# Altium footprint library Miscellaneous Devices LC.PcbLib: 776 footprints (part 11 of 49)
Each footprint in its own frame and in the unit in brackets; x right, y up, seen from the top. Pads: shape width x height; smd on the part's side, far side on the other; paste and mask are expansions set on the pad; w line width, h text height; cw(c..) or ccw(c..) is an arc to the next point about the centre after c.
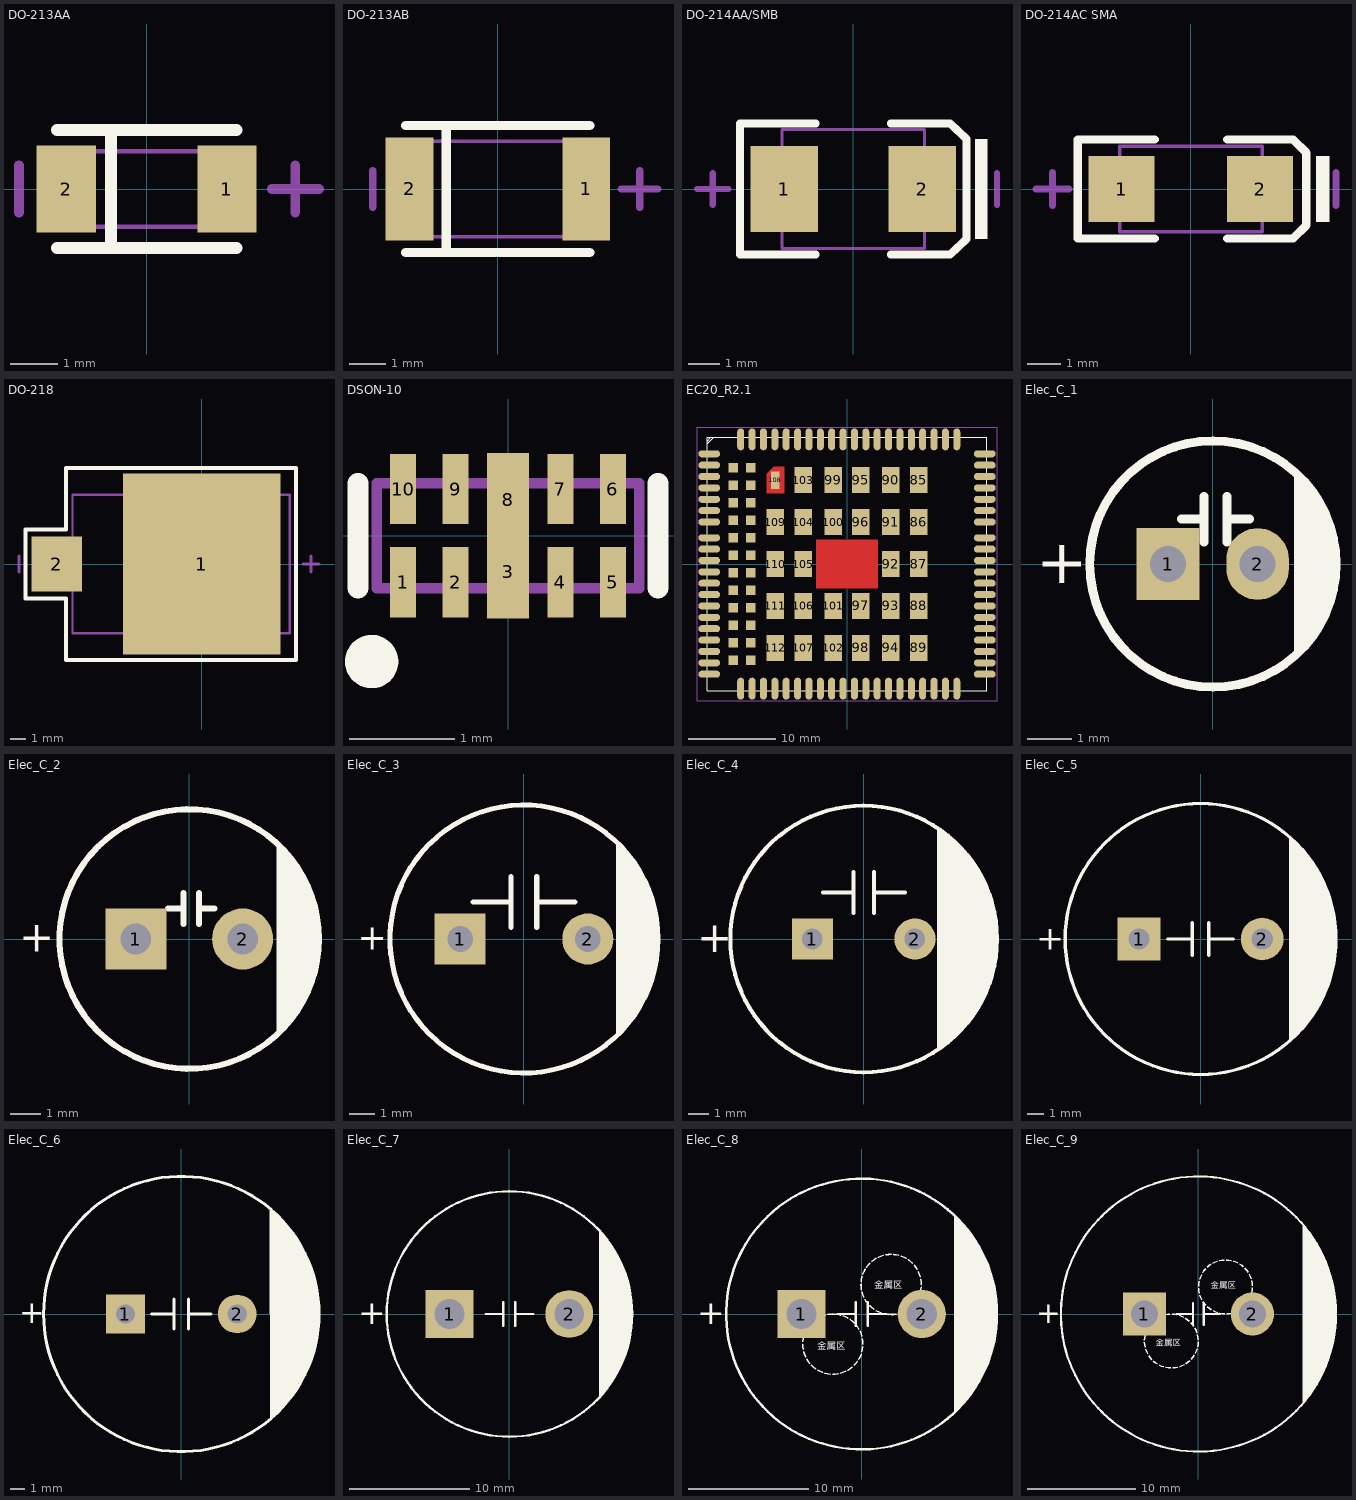
[diagram p10: the footprints below, top view; thin cyan lines are the x and y axes]

## DO-213AA [mm]
pads (2):
  rect 1.25x1.85 smd: 1(1.7,0) 2(-1.7,0)
Top Overlay:
  lines w0.254: -1.9,-1.25 1.9,-1.25 ; -1.9,1.25 1.9,1.25 ; -0.75,-1.25 -0.75,1.25
Mechanical 13:
  lines w0.1: -1.8,-0.8 1.8,-0.8 1.8,0.8 -1.8,0.8 -1.8,-0.8
Mechanical 15:
  lines w0.203: -2.7,-0.5 -2.7,0.5 ; 2.65,0 3.65,0 ; 3.15,-0.5 3.15,0.5

## DO-213AB [mm]
pads (2):
  rect 1.3x2.8 smd: 1(2.4,0) 2(-2.4,0)
Top Overlay:
  lines w0.254: -2.5,-1.725 2.5,-1.725 ; -2.5,1.725 2.5,1.725 ; -1.4,-1.725 -1.4,1.7
Mechanical 13:
  lines w0.1: -2.5,-1.3 2.5,-1.3 2.5,1.3 -2.5,1.3 -2.5,-1.3
Mechanical 15:
  lines w0.203: -3.4,-0.5 -3.4,0.5 ; 3.35,0 4.35,0 ; 3.85,-0.5 3.85,0.5

## DO-214AA/SMB [mm]
pads (2):
  rect 2.159x2.743 smd: 1(-2.21,0) 2(2.21,0)
Top Overlay:
  region: 4.296,1.6 3.896,1.6 3.896,-1.6 4.296,-1.6
  lines w0.254: -1.2,-2.1 -3.625,-2.1 -3.625,2.1 -1.2,2.1 ; 1.2,-2.1 3.1,-2.1 3.625,-1.6 3.625,1.6 3.1,2.1 1.2,2.1
Mechanical 13:
  lines w0.1: -2.285,-1.905 2.285,-1.905 2.285,1.905 -2.285,1.905 -2.285,-1.905
Mechanical 15:
  lines w0.203: -5,0 -4,0 ; -4.5,-0.5 -4.5,0.5 ; 4.6,-0.5 4.6,0.5
3D body "DO-214AA.STEP": height 2.5, standoff 0, extent -2.8,-1.95 2.8,1.95

## DO-214AC SMA [mm]
pads (2):
  rect 2x2 smd: 1(-2.1,0) 2(2.1,0)
Top Overlay:
  region: 4.2,1 3.8,1 3.8,-1 4.2,-1
  lines w0.254: -1.1,-1.5 -3.431,-1.5 -3.431,1.5 -1.1,1.5 ; 1.1,-1.5 3.1,-1.5 3.5,-1.1 3.5,1.1 3.1,1.5 1.1,1.5
Mechanical 13:
  lines w0.1: -2.16,-1.3 -2.16,1.3 2.16,1.3 2.16,-1.3 -2.16,-1.3
Mechanical 15:
  lines w0.203: -4.7,0 -3.7,0 ; -4.2,-0.5 -4.2,0.5 ; 4.4,-0.5 4.4,0.5
3D body "DO-214AC.STEP": height 2.4, standoff 0, extent -2.2,-1.25 2.4,1.45

## DO-218 [mm] "=DO-218AB"
pads (2):
  rect 10x11.5 smd: 1(0,0)
  rect 3.2x3.5 smd: 2(-9.2,0)
Top Overlay:
  lines w0.254: -11.2,-2.2 -11.2,2.2 -8.6,2.2 -8.6,6.1 6,6.1 6,-6.1 -8.6,-6.1 -8.6,-2.2 -11.2,-2.2
Mechanical 13:
  lines w0.152: -8.2,-4.4 -8.2,4.4 5.6,4.4 5.6,-4.4 -8.2,-4.4
Mechanical 15:
  lines w0.203: -11.6,-0.5 -11.6,0.5 ; 6.45,0 7.45,0 ; 6.95,-0.5 6.95,0.5
3D body "User Library-DO-218AB.STEP": height 5, standoff 0, extent -9.8,-5 5.629,5

## DSON-10 [mm]
pads (10):
  rect 0.25x0.67 smd mask+0.051: 1(-1,-0.445) 2(-0.5,-0.445) 4(0.5,-0.445) 5(1,-0.445) 6(1,0.445) 7(0.5,0.445) 9(-0.5,0.445) 10(-1,0.445)
  rect 0.4x0.889 smd mask+0.051: 3(0,-0.343) 8(0,0.343)
Top Overlay:
  circle w0.254: c-1.3,-1.2 r0.127
  lines w0.2: -1.43,-0.5 -1.43,0.5 ; 1.43,-0.5 1.43,0.5
Mechanical 13:
  lines w0.1: -1.25,-0.5 1.25,-0.5 1.25,0.5 -1.25,0.5 -1.25,-0.5

## EC20_R2.1 [mm]
pads (132):
  oval 2.5x0.8 smd mask+0.05: 1(-15.75,12.6) 2(-15.75,11.3) 3(-15.75,10) 4(-15.75,8.7) 5(-15.75,7.4) 6(-15.75,6.1) 7(-15.75,4.8) 8(-15.75,0.4) 9(-15.75,-0.9) 10(-15.75,-2.2) 11(-15.75,-3.5) 12(-15.75,-4.8) 13(-15.75,-6.1) 14(-15.75,-7.4) 15(-15.75,-8.7) 16(-15.75,-10) 17(-15.75,-11.3) 18(-15.75,-12.6) 37(15.75,-12.6) 38(15.75,-11.3) 39(15.75,-10) 40(15.75,-8.7) 41(15.75,-7.4) 42(15.75,-6.1) 43(15.75,-4.8) 44(15.75,-3.5) 45(15.75,-2.2) 46(15.75,-0.9) 47(15.75,0.4) 48(15.75,4.8) 49(15.75,6.1) 50(15.75,7.4) 51(15.75,8.7) 52(15.75,10) 53(15.75,11.3) 54(15.75,12.6) 141(-15.75,3) 142(-15.75,1.7) 143(15.75,1.7) 144(15.75,3)
  oval 0.8x2.5 smd mask+0.05: 19(-9.55,-14.25) 20(-8.25,-14.25) 21(-6.95,-14.25) 22(-5.65,-14.25) 23(-4.35,-14.25) 24(-3.05,-14.25) 25(-1.75,-14.25) 26(-0.45,-14.25) 27(0.85,-14.25) 28(2.15,-14.25) 29(3.45,-14.25) 30(4.75,-14.25) 31(6.05,-14.25) 32(7.35,-14.25) 33(8.65,-14.25) 34(9.95,-14.25) 35(11.25,-14.25) 36(12.55,-14.25) 55(12.55,14.25) 56(11.25,14.25) 57(9.95,14.25) 58(8.65,14.25) 59(7.35,14.25) 60(6.05,14.25) 61(4.75,14.25) 62(3.45,14.25) 63(2.15,14.25) 64(0.85,14.25) 65(-0.45,14.25) 66(-1.75,14.25) 67(-3.05,14.25) 68(-4.35,14.25) 69(-5.65,14.25) 70(-6.95,14.25) 71(-8.25,14.25) 72(-9.55,14.25) 113(-10.85,14.25) 114(-12.15,14.25) 115(-10.85,-14.25) 116(-12.15,-14.25)
  rect 2x3 smd mask+0.05: 85(8.2,9.6) 86(8.2,4.8) 87(8.2,0) 88(8.2,-4.8) 89(8.2,-9.6) 90(5,9.6) 91(5,4.8) 92(5,0) 93(5,-4.8) 94(5,-9.6) 95(1.6,9.6) 96(1.6,4.8) 97(1.6,-4.8) 98(1.6,-9.6) 99(-1.6,9.6) 100(-1.6,4.8) 101(-1.6,-4.8) 102(-1.6,-9.6) 103(-5,9.6) 104(-5,4.8) 105(-5,0) 106(-5,-4.8) 107(-5,-9.6) 109(-8.2,4.8) 110(-8.2,0) 111(-8.2,-4.8) 112(-8.2,-9.6)
  rect 1x2 smd: 108(-8.2,9.6)
  rect 1.1x1.1 smd mask+0.05: 117(-11,11) 118(-11,9) 119(-11,7) 120(-11,5) 121(-11,3) 122(-11,1) 123(-11,-1) 124(-11,-3) 125(-11,-5) 126(-11,-7) 127(-11,-9) 128(-11,-11) 129(-13,11) 130(-13,9) 131(-13,7) 132(-13,5) 133(-13,3) 134(-13,1) 135(-13,-1) 136(-13,-3) 137(-13,-5) 138(-13,-7) 139(-13,-9) 140(-13,-11)
Top Layer:
  region: -9.2,10.3 -8.4,11.1 -7.2,11.1 -7.2,8.1 -9.2,8.1
  pour cut-out: 3.5,2.8 -3.5,2.8 -3.5,-2.8 3.5,-2.8
Top Overlay:
  lines w0.102: -16,13.75 -15.25,14.5 ; -16,14.5 16,14.5 16,-14.5 -16,-14.5 -16,14.5 ; -16,14.5 -15.55,14.5 -16,14.05 -16,14.5
Top Paste:
  region: -9.2,10.3 -8.4,11.1 -7.2,11.1 -7.2,8.1 -9.2,8.1
Top Solder:
  region: -9.25,8.05 -7.15,8.05 -7.15,11.15 -8.45,11.15 -9.25,10.35
Mechanical 1:
  lines w0.01: -17.15,-15.65 17.15,-15.65 17.15,15.65 -17.15,15.65 -17.15,-15.65

## Elec_C_1 [mm]
pads (2):
  rect 1.4x1.6 hole 0.8: 1(-1,0)
  oval 1.4x1.6 hole 0.8: 2(1,0)
Top Overlay:
  circle w0.2: c0,0 r2.75
  region: 2.125,1.85 1.9,1.85 1.9,1.475 2.125,1.475
  region: 2.275,1.6 1.9,1.6 1.9,1.275 2.275,1.275
  region: 2.425,1.4 1.925,1.4 1.925,0.975 2.425,0.975
  region: 2.475,-0.85 2.275,-0.85 2.275,-1.225 2.475,-1.225
  region: 2.375,-0.875 2.125,-0.875 2.125,-1.425 2.375,-1.425
  region: 2.075,-1.55 1.875,-1.55 1.875,-1.825 2.075,-1.825
  region: 2.175,-1.4 1.875,-1.4 1.875,-1.7 2.175,-1.7
  region: 2.25,-0.95 1.875,-0.95 1.875,-1.55 2.25,-1.55
  region: 2.55,1.15 1.9,1.15 1.9,-1.05 2.55,-1.05
  region: 2.725,0.4 2.475,0.4 2.475,-0.625 2.725,-0.625
  region: 2.575,0.975 2.225,0.975 2.225,-0.975 2.575,-0.975
  region: 2.65,0.8 2.4,0.8 2.4,-0.55 2.65,-0.55
  lines w0.127: 1.875,-1.975 1.875,1.95
  lines w0.2: -0.702,1 -0.194,1 ; -0.194,0.492 -0.194,1.508 ; 0.314,0.492 0.314,1.508 ; 0.314,1 0.822,1
  text "+" at -3.95,-0.425 h1
3D body "CAPACITOR- PANASONIC M SERIES.STEP": height 11, standoff -5, extent -2.377,-2.667 2.623,2.333

## Elec_C_2 [mm]
pads (2):
  rect 2x2 hole 1: 1(-1.75,0)
  round 2 hole 1: 2(1.75,0)
Top Overlay:
  circle w0.2: c0,0 r4.25
  lines w0.127: 2.925,-3.075 2.925,3.1 ; 3,2.925 3.025,-2.975 ; 3.075,-2.875 3.125,2.775 ; 3.075,2.85 3.1,2.55 ; 3.175,-2.725 3.225,2.7 ; 3.25,-2.625 3.325,2.575 ; 3.35,-2.6 3.4,2.475 ; 3.45,-2.4 3.5,2.3 ; 3.5,-2.225 3.575,2.225 ; 3.6,-2.15 3.675,2.05 ; 3.7,-1.95 3.775,1.875 ; 3.8,-1.825 3.85,1.625 ; 3.875,-1.525 3.925,1.475 ; 3.95,-1.275 4.05,1.2 4.025,1.2 ; 4.05,-1 4.1,0.775 ; 4.1,-0.6 4.15,0.25
  lines w0.2: -0.702,1 -0.194,1 ; -0.194,0.492 -0.194,1.508 ; 0.314,0.492 0.314,1.508 ; 0.314,1 0.822,1
  text "+" at -5.575,-0.425 h1
3D body "8X12.STEP": height 12, standoff -2.5, extent -3.96,-4.047 4.04,3.953

## Elec_C_3 [mm]
pads (2):
  rect 2x2 hole 1: 1(-2.5,0)
  round 2 hole 1: 2(2.5,0)
Top Overlay:
  circle w0.2: c0,0 r5.25
  lines w0.127: 3.675,-3.775 3.675,3.725 ; 3.725,3.65 3.775,-3.55 ; 3.825,3.525 3.875,-3.45
  lines w0.2: -2,1.447 -0.5,1.447 ; -0.5,0.447 -0.5,2.447 ; 0.5,0.447 0.5,2.447 ; 0.5,1.447 2,1.447
  lines w0.254: 3.9,3.375 3.95,-3.225 ; 4.05,3.2 4.075,-3.1 ; 4.175,3.025 4.225,-2.925 ; 4.35,-2.725 4.35,2.725 ; 4.5,-2.475 4.5,2.525 ; 4.6,-2.175 4.65,2.2 ; 4.775,-1.95 4.775,1.925 ; 4.9,-1.575 4.925,1.5 ; 5.025,-1.05 5.05,1.025
  text "+" at -6.5,-0.425 h1
3D body "10X12.STEP": height 12, standoff -2.5, extent -4.833,-4.92 5.167,5.08

## Elec_C_4 [mm]
pads (2):
  rect 2x2 hole 1: 1(-2.5,0)
  round 2 hole 1: 2(2.5,0)
Top Overlay:
  circle w0.2: c0,0 r6.5
  lines w0.2: -1.99,2.272 -0.49,2.272 ; -0.49,1.272 -0.49,3.272 ; 0.51,1.272 0.51,3.272 ; 0.51,2.272 2.01,2.272
  lines w0.254: 3.7,-5.3 3.7,5.25 ; 3.85,-5.125 3.875,5.1 ; 3.975,-4.975 4.025,5 ; 4.125,-4.925 4.125,4.825 ; 4.275,4.775 4.325,-4.75 ; 4.45,-4.6 4.45,4.6 ; 4.6,-4.45 4.6,4.475 ; 4.725,-4.3 4.8,4.25 ; 4.9,-4.2 4.9,4.1 ; 5.025,-3.975 5.075,3.9 ; 5.15,-3.725 5.2,3.775 ; 5.325,-3.6 5.375,3.475 ; 5.475,3.35 5.5,-3.275 ; 5.6,-3.1 5.625,3.05 ; 5.725,2.825 5.775,-2.85 ; 5.875,2.55 5.9,-2.575 ; 6,2.275 6.05,-2.075 ; 6.125,1.825 6.2,-1.675 ; 6.25,1.275 6.3,-1.05
  text "+" at -8.125,-0.65 h1.5
3D body "RB_2__4.STEP": height 20.1, standoff -3, extent -6.218,-6.277 6.282,6.223

## Elec_C_5 [mm]
pads (2):
  rect 2.6x2.6 hole 1.3: 1(-3.75,0)
  round 2.6 hole 1.3: 2(3.75,0)
Top Overlay:
  circle w0.2: c0,0 r8.25
  lines w0.2: -2,0 -0.5,0 ; -0.5,-1 -0.5,1 ; 0.5,-1 0.5,1 ; 0.5,0 2,0
  lines w0.254: 5.5,-6.1 5.5,6.1 ; 5.65,-5.9 5.675,5.825 ; 5.8,-5.7 5.8,5.75 ; 5.975,-5.6 5.975,5.55 ; 6.1,5.475 6.125,-5.325 ; 6.275,5.2 6.3,-5.25 ; 6.425,5.075 6.45,-4.95 ; 6.575,-4.825 6.575,4.8 ; 6.675,-4.575 6.7,4.65 ; 6.8,-4.475 6.85,4.4 ; 6.975,-4.225 6.975,4.225 ; 7.1,-4.05 7.125,3.925 ; 7.225,3.75 7.275,-3.675 ; 7.375,3.45 7.4,-3.425 ; 7.5,3.2 7.55,-3.05 ; 7.675,-2.8 7.675,2.775 ; 7.8,-2.275 7.8,2.375 ; 7.9,1.875 7.925,-1.925 ; 8.025,1.4 8.1,-1.225
  text "+" at -10.025,-0.65 h1.5
3D body "Capacitor RB_3_6.step": height 25.2, standoff -3.4, extent -8.025,-8.131 7.975,7.869

## Elec_C_6 [mm]
pads (2):
  rect 2.6x2.6 hole 1.3: 1(-3.75,0)
  round 2.6 hole 1.3: 2(3.75,0)
Top Overlay:
  circle w0.2: c0,0 r9.25
  lines w0.2: -2,0 -0.5,0 ; -0.5,-1 -0.5,1 ; 0.5,-1 0.5,1 ; 0.5,0 2,0
  lines w0.254: 6.05,6.95 6.075,-6.925 ; 6.175,6.7 6.225,-6.725 ; 6.3,6.625 6.4,-6.55 ; 6.5,6.4 6.525,-6.475 ; 6.65,6.325 6.7,-6.275 ; 6.8,-6.125 6.85,6.075 ; 6.95,5.975 6.975,-5.875 ; 7.075,5.75 7.125,-5.775 ; 7.225,5.65 7.275,-5.5 ; 7.4,5.45 7.45,-5.35 ; 7.55,5.2 7.6,-5.075 ; 7.725,4.925 7.75,-4.875 ; 7.85,4.675 7.95,-4.55 ; 8.05,4.425 8.075,-4.325 ; 8.15,4.075 8.225,-3.975 ; 8.325,3.8 8.4,-3.725 ; 8.45,3.475 8.55,-3.225 ; 8.625,3.125 8.7,-2.9 ; 8.725,2.65 8.875,-2.3 ; 8.875,2.225 8.975,-1.725 ; 9.025,1.5 9.1,-1.05
  text "+" at -10.9,-0.625 h1.5
3D body "RB_3_6.STEP": height 25.2, standoff -3.4, extent -8.03,-8 7.97,8

## Elec_C_7 [mm]
pads (2):
  rect 4x4 hole 2.5: 1(-5,0)
  round 4 hole 2.5: 2(5,0)
Top Overlay:
  circle w0.2: c0,0 r10.25
  region: 7.825,6.675 7.55,6.675 7.55,6.1 7.825,6.1
  region: 7.775,6.8 7.575,6.8 7.575,6.55 7.775,6.55
  region: 7.925,6.5 7.55,6.5 7.55,5.75 7.925,5.75
  region: 8.075,6.4 7.55,6.4 7.55,4.45 8.075,4.45
  region: 8.25,6.2 7.95,6.2 7.95,5.375 8.25,5.375
  region: 8.35,5.975 7.85,5.975 7.85,4.75 8.35,4.75
  region: 8.475,5.85 7.975,5.85 7.975,3.725 8.475,3.725
  region: 8.625,5.625 8.125,5.625 8.125,4.6 8.625,4.6
  region: 8.775,5.375 8.275,5.375 8.275,4.625 8.775,4.625
  region: 8.95,5.125 8.375,5.125 8.375,4.625 8.95,4.625
  region: 9.075,4.825 8.475,4.825 8.475,3.95 9.075,3.95
  region: 9.2,4.575 8.575,4.575 8.575,3.475 9.2,3.475
  region: 9.35,4.35 8.85,4.35 8.85,3.225 9.35,3.225
  region: 9.5,3.975 9.05,3.975 9.05,3.075 9.5,3.075
  region: 9.6,3.625 9.15,3.625 9.15,2.85 9.6,2.85
  region: 9.725,3.425 9.325,3.425 9.325,2.475 9.725,2.475
  region: 9.85,3.05 9.275,3.05 9.275,2.05 9.85,2.05
  region: 9.95,2.6 9.025,2.6 9.025,0.575 9.95,0.575
  region: 10.075,2.075 9.05,2.075 9.05,0.1 10.075,0.1
  region: 10.175,1.4 9.1,1.4 9.1,-0.95 10.175,-0.95
  region: 10.15,-0.7 9.15,-0.7 9.15,-1.525 10.15,-1.525
  region: 10.1,-1.275 9.075,-1.275 9.075,-1.825 10.1,-1.825
  region: 10.025,-1.5 9.475,-1.5 9.475,-2.1 10.025,-2.1
  region: 9.95,-1.525 9.3,-1.525 9.3,-2.35 9.95,-2.35
  region: 9.9,-1.775 9.15,-1.775 9.15,-2.475 9.9,-2.475
  region: 9.85,-2.275 9.05,-2.275 9.05,-2.95 9.85,-2.95
  region: 9.75,-2.475 8.825,-2.475 8.825,-3.175 9.75,-3.175
  region: 9.675,-2.775 8.675,-2.775 8.675,-3.45 9.675,-3.45
  region: 9.575,-2.975 8.625,-2.975 8.625,-3.725 9.575,-3.725
  region: 9.475,-3.45 8.475,-3.45 8.475,-3.95 9.475,-3.95
  region: 9.112,-3.588 8.7,-4 9.038,-4.337 9.45,-3.925
  region: 8.575,-3.775 8.575,-4.325 9.275,-4.325 9.275,-3.775
  region: 8.875,-3.675 8.875,-4.225 9.35,-4.225 9.35,-3.675
  region: 8.325,-3.95 8.325,-4.575 9.2,-4.575 9.2,-3.95
  region: 8,-4.025 8,-4.75 9.075,-4.75 9.075,-4.025
  region: 8,-4.275 8,-5.1 8.9,-5.1 8.9,-4.275
  region: 8.65,-4.4 8.65,-4.925 9.05,-4.925 9.05,-4.4
  region: 7.975,-4.725 7.975,-5.325 8.775,-5.325 8.775,-4.725
  region: 7.775,-5.2 7.775,-5.475 8.675,-5.475 8.675,-5.2
  region: 7.55,-6.325 7.55,-6.7 7.75,-6.7 7.75,-6.325
  region: 7.55,-6.6 7.55,-6.75 7.675,-6.75 7.675,-6.6
  region: 7.55,-5.95 7.55,-6.575 7.825,-6.575 7.825,-5.95
  region: 7.75,-5.85 7.75,-6.475 7.925,-6.475 7.925,-5.85
  region: 7.775,-5.85 7.775,-6.375 8.025,-6.375 8.025,-5.85
  region: 7.875,-5.775 7.875,-6.25 8.075,-6.25 8.075,-5.775
  region: 7.8,-5.525 7.8,-6.125 8.225,-6.125 8.225,-5.525
  region: 7.875,-5.975 7.875,-6.175 8.2,-6.175 8.2,-5.975
  region: 7.575,-4.925 7.575,-5.975 8.125,-5.975 8.125,-4.925
  region: 8.025,-5.2 8.025,-5.95 8.4,-5.95 8.4,-5.2
  region: 8.275,-5.4 8.275,-5.7 8.525,-5.7 8.525,-5.4
  region: 8.425,-5.375 8.425,-5.575 8.6,-5.575 8.6,-5.375
  region: 7.575,-0.325 7.575,-5.025 8.875,-5.025 8.875,-0.325
  region: 7.975,3.8 7.975,-3.675 9.375,-3.675 9.375,3.8
  region: 7.55,4.625 7.55,-0.7 8.95,-0.7 8.95,4.625
  lines w0.127: 7.55,-6.9 7.55,6.9
  lines w0.2: -2,0 -0.5,0 ; -0.5,-1 -0.5,1 ; 0.5,-1 0.5,1 ; 0.5,0 2,0
  text "+" at -12.65,-0.85 h2
3D body "RB_4__8.STEP": height 35.2, standoff -3, extent -10.099,-10.021 9.901,9.979

## Elec_C_8 [mm]
pads (2):
  rect 4x4 hole 2.5: 1(-5,0)
  round 4 hole 2.5: 2(5,0)
Top Overlay:
  circle w0.2: c0,0 r11.25
  region: 8.45,7.45 7.75,7.45 7.75,-7.35 8.45,-7.35
  region: 9.175,6.6 8.125,6.6 8.125,-6.6 9.175,-6.6
  region: 9.825,5.6 8.85,5.6 8.85,-5.45 9.825,-5.45
  region: 10.3,4.55 9,4.55 9,-4.6 10.3,-4.6
  region: 10.55,3.9 9.875,3.9 9.875,-4.05 10.55,-4.05
  region: 10.725,3.45 10.175,3.45 10.175,-3.4 10.725,-3.4
  region: 8.15,-7.25 7.75,-7.25 7.75,-7.8 8.15,-7.8
  region: 8,-7.725 7.75,-7.725 7.75,-7.975 8,-7.975
  region: 8.25,-7.2 8.025,-7.2 8.025,-7.65 8.25,-7.65
  region: 8.425,-7.175 8.125,-7.175 8.125,-7.525 8.425,-7.525
  region: 8.6,-6.4 8.3,-6.4 8.3,-7.25 8.6,-7.25
  region: 8.725,-6.375 8.475,-6.375 8.475,-7.15 8.725,-7.15
  region: 8.475,-7.025 8.225,-7.025 8.225,-7.325 8.475,-7.325
  region: 8.85,-6.425 8.575,-6.425 8.575,-6.975 8.85,-6.975
  region: 9.025,-6.45 8.75,-6.45 8.75,-6.8 9.025,-6.8
  region: 9.35,-5.25 8.925,-5.25 8.925,-6.35 9.35,-6.35
  region: 9.45,-5.175 9.1,-5.175 9.1,-6.1 9.45,-6.1
  region: 9.575,-5.125 9.175,-5.125 9.175,-5.9 9.575,-5.9
  region: 9.75,-5.225 9.425,-5.225 9.425,-5.75 9.75,-5.75
  region: 9.6,-5.65 9.225,-5.65 9.225,-5.95 9.6,-5.95
  region: 9.975,-4.325 9.675,-4.325 9.675,-5.325 9.975,-5.325
  region: 10.1,-4.3 9.875,-4.3 9.875,-4.95 10.1,-4.95
  region: 10.2,-4.425 10,-4.425 10,-4.8 10.2,-4.8
  region: 10.025,-4.725 9.775,-4.725 9.775,-5.025 10.025,-5.025
  region: 10.4,-3.9 10.175,-3.9 10.175,-4.325 10.4,-4.325
  region: 10.65,-3.2 10.4,-3.2 10.4,-3.65 10.65,-3.65
  region: 10.825,-1.825 10.275,-1.825 10.275,-3.075 10.825,-3.075
  region: 10.95,-1 10.325,-1 10.325,-2.65 10.95,-2.65
  region: 11.1,-0.8 10.4,-0.8 10.4,-2.1 11.1,-2.1
  region: 10.9,-2.225 10.525,-2.225 10.525,-2.8 10.9,-2.8
  region: 11.225,0.55 10.375,0.55 10.375,-1.175 11.225,-1.175
  region: 11.175,1.7 10.2,1.7 10.2,-0.175 11.175,-0.175
  region: 11.075,2.25 10.425,2.25 10.425,1.375 11.075,1.375
  region: 11.025,2.675 10.475,2.675 10.475,1.975 11.025,1.975
  region: 10.875,3.1 10.45,3.1 10.45,2.375 10.875,2.375
  region: 10.675,3.7 10.4,3.7 10.4,3.275 10.675,3.275
  region: 10.475,4.3 10.025,4.3 10.025,3.575 10.475,3.575
  region: 10.225,4.925 9.6,4.925 9.6,4.35 10.225,4.35
  region: 10.025,5.275 9.6,5.275 9.6,4.775 10.025,4.775
  region: 9.625,5.925 9.025,5.925 9.025,5.525 9.625,5.525
  region: 9.75,5.725 9.45,5.725 9.45,5.5 9.75,5.5
  region: 9.5,6.15 9.05,6.15 9.05,5.775 9.5,5.775
  region: 9.375,6.35 9.025,6.35 9.025,6.025 9.375,6.025
  region: 8.975,6.825 8.35,6.825 8.35,6.45 8.975,6.45
  region: 9.075,6.725 8.8,6.725 8.8,6.375 9.075,6.375
  region: 8.85,7.075 8.125,7.075 8.125,6.525 8.85,6.525
  region: 8.625,7.3 8.175,7.3 8.175,6.825 8.625,6.825
  region: 8.25,7.675 7.75,7.675 7.75,7.25 8.25,7.25
  region: 8.325,7.6 8.15,7.6 8.15,7.225 8.325,7.225
  region: 8.125,7.825 7.725,7.825 7.725,7.475 8.125,7.475
  region: 7.975,8 7.775,8 7.775,7.725 7.975,7.725
  lines w0.127: 7.75,-8.125 7.75,8.1
  lines w0.13: -4.892,-2.499 ccw(c-2.392,-2.499) -4.854,-2.933 ; -4.882,-2.281 cw(c-2.392,-2.499) -4.807,-1.852 ; -4.807,-3.146 ccw(c-2.392,-2.499) -4.658,-3.556 ; -4.741,-1.644 cw(c-2.392,-2.499) -4.557,-1.249 ; -4.557,-3.749 ccw(c-2.392,-2.499) -4.307,-4.106 ; -4.44,-1.065 cw(c-2.392,-2.499) -4.16,-0.732 ; -3.999,-0.584 cw(c-2.392,-2.499) -3.642,-0.334 ; -3.642,-4.664 ccw(c-2.392,-2.499) -3.247,-4.849 ; -3.448,-0.234 cw(c-2.392,-2.499) -3.039,-0.085 ; -3.039,-4.914 ccw(c-2.392,-2.499) -2.61,-4.99 ; -2.826,-0.037 cw(c-2.392,-2.499) -2.392,0.001 ; -2.81,-0.027 -2.017,-0.027 ; -2.392,-4.999 ccw(c-2.392,-2.499) -1.958,-4.961 ; -2.174,-0.009 cw(c-2.392,-2.499) -1.745,-0.085 ; -1.745,-4.914 ccw(c-2.392,-2.499) -1.335,-4.765 ; -1.537,-0.15 cw(c-2.392,-2.499) -1.142,-0.334 ; -1.142,-4.664 ccw(c-2.392,-2.499) -0.785,-4.414 ; -0.958,-0.451 cw(c-2.392,-2.499) -0.624,-0.732 ; -0.624,-4.267 ccw(c-2.392,-2.499) -0.344,-3.933 ; -0.477,-0.892 cw(c-2.392,-2.499) -0.227,-1.249 ; -0.227,-3.749 ccw(c-2.392,-2.499) -0.043,-3.354 ; -0.126,-1.443 cw(c-2.392,-2.499) 0.023,-1.852 ; -0.05,2.45 ccw(c2.45,2.45) -0.012,2.016 ; -0.04,2.668 cw(c2.45,2.45) 0.036,3.097 ; 0.023,-3.146 ccw(c-2.392,-2.499) 0.099,-2.717 ; 0.036,1.803 ccw(c2.45,2.45) 0.185,1.394 ; 0.07,-2.065 cw(c-2.392,-2.499) 0.108,-2.499 ; 0.101,3.305 cw(c2.45,2.45) 0.285,3.7 ; 0.285,1.2 ccw(c2.45,2.45) 0.535,0.843 ; 0.403,3.884 cw(c2.45,2.45) 0.683,4.218 ; 0.683,0.683 ccw(c2.45,2.45) 1.017,0.403 ; 0.844,4.366 cw(c2.45,2.45) 1.2,4.615 ; 1.2,0.285 ccw(c2.45,2.45) 1.595,0.101 ; 1.394,4.716 cw(c2.45,2.45) 1.803,4.865 ; 1.803,0.036 ccw(c2.45,2.45) 2.233,-0.04 ; 2.016,4.912 cw(c2.45,2.45) 2.45,4.95 ; 2.076,-0.022 2.868,-0.022 ; 2.45,-0.05 ccw(c2.45,2.45) 2.885,-0.012 ; 2.668,4.941 cw(c2.45,2.45) 3.098,4.865 ; 3.098,0.036 ccw(c2.45,2.45) 3.507,0.185 ; 3.306,4.8 cw(c2.45,2.45) 3.7,4.615 ; 3.7,0.285 ccw(c2.45,2.45) 4.057,0.535 ; 4.218,0.683 ccw(c2.45,2.45) 4.498,1.016 ; 4.366,4.057 cw(c2.45,2.45) 4.616,3.7 ; 4.616,1.2 ccw(c2.45,2.45) 4.8,1.595 ; 4.716,3.507 cw(c2.45,2.45) 4.865,3.097 ; 4.865,1.803 ccw(c2.45,2.45) 4.941,2.233 ; 4.913,2.885 cw(c2.45,2.45) 4.95,2.45 ; -4.16,-4.267 ccw(c-2.392,-2.499) -3.826,-4.547 cw(c-2.392,-2.499) -4.16,-4.267 ; 3.884,4.498 cw(c2.45,2.45) 4.218,4.218 ccw(c2.45,2.45) 3.884,4.498
  lines w0.2: -2,0 -0.5,0 ; -0.5,-1 -0.5,1 ; 0.5,-1 0.5,1 ; 0.559,0 2.059,0
  text "+" at -13.675,-0.85 h2
  text "金属区" at 1.067,1.926 h1
  text "金属区" at -3.664,-3.137 h1
3D body "Capacitor RB_4__8.step": height 35.2, standoff -3, extent -9.764,-9.642 10.236,10.358

## Elec_C_9 [mm]
pads (2):
  rect 4x4 hole 2.5: 1(-5,0)
  round 4 hole 2.5: 2(5,0)
Top Overlay:
  circle w0.2: c0,0 r12.75
  region: 11.7,4.775 10.475,4.775 10.475,2 11.7,2
  region: 12.025,2.275 10.5,2.275 10.5,-3.725 12.025,-3.725
  region: 11.425,-3.425 10.475,-3.425 10.475,-5.6 11.425,-5.6
  region: 10.875,5.6 9.7,5.6 9.7,-6.275 10.875,-6.275
  region: 10.35,7.325 9.7,7.325 9.7,6.05 10.35,6.05
  region: 10.975,6.35 9.7,6.35 9.7,5.475 10.975,5.475
  region: 11.325,6 11,6 11,5.5 11.325,5.5
  region: 11.175,6.175 10.9,6.175 10.9,5.625 11.175,5.625
  region: 11.075,6.4 10.625,6.4 10.625,5.75 11.075,5.75
  region: 10.975,6.575 10.55,6.575 10.55,5.875 10.975,5.875
  region: 10.85,6.775 10.6,6.775 10.6,6.125 10.85,6.125
  region: 10.75,6.95 10.35,6.95 10.35,6.175 10.75,6.175
  region: 10.625,7.125 10.2,7.125 10.2,6.35 10.625,6.35
  region: 10.5,7.325 10.15,7.325 10.15,6.575 10.5,6.575
  region: 10.375,7.525 10,7.525 10,6.8 10.375,6.8
  region: 10.25,7.7 9.85,7.7 9.85,6.9 10.25,6.9
  region: 10.1,7.9 9.75,7.9 9.75,7.225 10.1,7.225
  region: 9.925,8.075 9.675,8.075 9.675,7.275 9.925,7.275
  region: 11.575,5.45 11.275,5.45 11.275,5 11.575,5
  region: 11.475,5.65 9.775,5.65 9.775,4.725 11.475,4.725
  region: 11.725,5.025 11.3,5.025 11.3,4.65 11.725,4.65
  region: 11.65,5.275 10.75,5.275 10.75,4.675 11.65,4.675
  region: 11.95,4.675 11.6,4.675 11.6,4.25 11.95,4.25
  region: 11.8,4.925 10.875,4.925 10.875,4.25 11.8,4.25
  region: 12.075,4.225 11.725,4.225 11.725,3.7 12.075,3.7
  region: 11.975,4.475 10.95,4.475 10.95,3.675 11.975,3.675
  region: 12.15,3.975 11.325,3.975 11.325,1.375 12.15,1.375
  region: 12.3,3.65 11.9,3.65 11.9,3.05 12.3,3.05
  region: 12.375,3.15 11.875,3.15 11.875,2.7 12.375,2.7
  region: 12.525,2.7 11.825,2.7 11.825,2.05 12.525,2.05
  region: 12.625,2.05 11.8,2.05 11.8,1.05 12.625,1.05
  region: 12.75,1.1 11.8,1.1 11.8,-0.875 12.75,-0.875
  region: 12.65,-0.6 12.175,-0.6 12.175,-1.5 12.65,-1.5
  region: 12.45,-0.85 11.8,-0.85 11.8,-2.6 12.45,-2.6
  region: 12.6,-1.425 12.25,-1.425 12.25,-2.125 12.6,-2.125
  region: 12.475,-1.925 12.05,-1.925 12.05,-2.775 12.475,-2.775
  region: 12.275,-2.525 11.65,-2.525 11.65,-3.25 12.275,-3.25
  region: 12.375,-2.75 12.15,-2.75 12.15,-3.15 12.375,-3.15
  region: 12.25,-2.8 12.05,-2.8 12.05,-3.525 12.25,-3.525
  region: 12.15,-2.875 11.9,-2.875 11.9,-3.875 12.15,-3.875
  region: 12.05,-3.15 11.775,-3.15 11.775,-4.15 12.05,-4.15
  region: 11.95,-3.5 10.9,-3.5 10.9,-4.425 11.95,-4.425
  region: 11.875,-4.225 11.675,-4.225 11.675,-4.575 11.875,-4.575
  region: 11.8,-4.275 11.575,-4.275 11.575,-4.9 11.8,-4.9
  region: 11.675,-4.425 11.4,-4.425 11.4,-5.175 11.675,-5.175
  region: 11.55,-4.55 11.225,-4.55 11.225,-5.475 11.55,-5.475
  region: 11.425,-4.975 11.025,-4.975 11.025,-5.725 11.425,-5.725
  region: 11.3,-5.5 11,-5.5 11,-5.95 11.3,-5.95
  region: 11.175,-5.6 10.825,-5.6 10.825,-6.125 11.175,-6.125
  region: 11.075,-5.7 10.75,-5.7 10.75,-6.3 11.075,-6.3
  region: 10.975,-5.85 10.725,-5.85 10.725,-6.475 10.975,-6.475
  region: 10.875,-5.925 10.525,-5.925 10.525,-6.65 10.875,-6.65
  region: 10.7,-6.55 10.4,-6.55 10.4,-6.95 10.7,-6.95
  region: 10.775,-6.25 10.575,-6.25 10.575,-6.8 10.775,-6.8
  region: 10.675,-6.15 10.2,-6.15 10.2,-6.9 10.675,-6.9
  region: 10.2,-5.475 9.65,-5.475 9.65,-7.4 10.2,-7.4
  region: 10.6,-6.525 10.025,-6.525 10.025,-7.125 10.6,-7.125
  region: 10.475,-6.95 10.175,-6.95 10.175,-7.25 10.475,-7.25
  region: 10.375,-7.05 10.075,-7.05 10.075,-7.475 10.375,-7.475
  region: 10.225,-7.125 9.925,-7.125 9.925,-7.65 10.225,-7.65
  region: 10.1,-7.175 9.8,-7.175 9.8,-7.8 10.1,-7.8
  region: 10,-7.375 9.75,-7.375 9.75,-7.925 10,-7.925
  region: 9.9,-7.6 9.7,-7.6 9.7,-8.075 9.9,-8.075
  lines w0.127: 9.7,-8.325 9.7,8.2
  lines w0.13: -4.996,-2.638 ccw(c-2.5,-2.494) -4.929,-3.084 ; -4.996,-2.438 cw(c-2.497,-2.497) -4.945,-1.99 ; -4.893,-1.797 cw(c-2.494,-2.5) -4.727,-1.377 ; -4.878,-3.277 ccw(c-2.504,-2.492) -4.698,-3.691 ; -4.627,-1.204 cw(c-2.492,-2.504) -4.359,-0.841 ; -4.218,-0.7 cw(c-2.492,-2.508) -3.864,-0.419 ; -4.176,-4.359 ccw(c-2.513,-2.492) -3.813,-4.627 ; -3.691,-0.319 cw(c-2.492,-2.513) -3.277,-0.139 ; -3.64,-4.727 ccw(c-2.517,-2.494) -3.22,-4.893 ; -3.084,-0.087 cw(c-2.494,-2.517) -2.638,-0.021 ; -3.027,-4.945 ccw(c-2.52,-2.497) -2.579,-4.996 ; -2.438,-0.021 cw(c-2.497,-2.52) -1.99,-0.072 ; -2.379,-4.996 ccw(c-2.523,-2.5) -1.932,-4.929 ; -1.797,-0.124 cw(c-2.5,-2.523) -1.377,-0.289 ; -1.739,-4.878 ccw(c-2.524,-2.504) -1.325,-4.698 ; -1.204,-0.389 cw(c-2.504,-2.524) -0.841,-0.658 ; -1.152,-4.598 ccw(c-2.525,-2.508) -0.799,-4.317 ; -0.7,-0.799 cw(c-2.508,-2.525) -0.419,-1.152 ; -0.658,-4.176 ccw(c-2.524,-2.513) -0.389,-3.813 ; -0.319,-1.325 cw(c-2.513,-2.524) -0.139,-1.739 ; -0.289,-3.64 ccw(c-2.523,-2.517) -0.124,-3.22 ; -0.087,-1.932 cw(c-2.517,-2.523) -0.021,-2.379 ; -0.072,-3.027 ccw(c-2.52,-2.52) -0.021,-2.579 ; 0.021,2.379 ccw(c2.517,2.523) 0.087,1.932 ; 0.021,2.579 cw(c2.52,2.52) 0.072,3.027 ; 0.124,3.22 cw(c2.523,2.517) 0.289,3.64 ; 0.139,1.739 ccw(c2.513,2.524) 0.319,1.325 ; 0.389,3.813 cw(c2.524,2.513) 0.658,4.176 ; 0.419,1.152 ccw(c2.508,2.525) 0.7,0.799 ; 0.799,4.317 cw(c2.525,2.508) 1.152,4.598 ; 0.841,0.658 ccw(c2.504,2.524) 1.204,0.389 ; 1.325,4.698 cw(c2.524,2.504) 1.739,4.878 ; 1.377,0.289 ccw(c2.5,2.523) 1.797,0.124 ; 1.932,4.929 cw(c2.523,2.5) 2.379,4.996 ; 1.99,0.072 ccw(c2.497,2.52) 2.438,0.021 ; 2.579,4.996 cw(c2.52,2.497) 3.027,4.945 ; 2.638,0.021 ccw(c2.494,2.517) 3.084,0.087 ; 3.22,4.893 cw(c2.517,2.494) 3.64,4.727 ; 3.277,0.139 ccw(c2.492,2.513) 3.691,0.319 ; 3.813,4.627 cw(c2.513,2.492) 4.176,4.359 ; 3.864,0.419 ccw(c2.492,2.508) 4.218,0.7 ; 4.359,0.841 ccw(c2.492,2.504) 4.627,1.204 ; 4.698,3.691 cw(c2.504,2.492) 4.878,3.277 ; 4.727,1.377 ccw(c2.494,2.5) 4.893,1.797 ; 4.929,3.084 cw(c2.5,2.494) 4.996,2.638 ; 4.945,1.99 ccw(c2.497,2.497) 4.996,2.438 ; -4.598,-3.864 ccw(c-2.508,-2.492) -4.317,-4.218 cw(c-2.508,-2.492) -4.598,-3.864 ; 4.317,4.218 cw(c2.508,2.492) 4.598,3.864 ccw(c2.508,2.492) 4.317,4.218
  lines w0.2: -2,0 -0.5,0 ; -0.5,-1 -0.5,1 ; 0.5,-1 0.5,1 ; 0.5,0 2,0
  text "金属区" at 1.151,2.161 h1
  text "金属区" at -3.947,-3.171 h1
  text "+" at -15.05,-0.85 h2
3D body "Capacitor RB_5_1_0.step": height 50.2, standoff -3.4, extent -12.537,-12.572 12.463,12.428